# Altium footprint library Ultrascale_PcbLib.PcbLib: 132 footprints (part 7 of 9)
Each footprint in its own frame and in the unit in brackets; x right, y up, seen from the top. Pads: shape width x height; smd on the part's side, far side on the other; paste and mask are expansions set on the pad; w line width, h text height; cw(c..) or ccw(c..) is an arc to the next point about the centre after c.
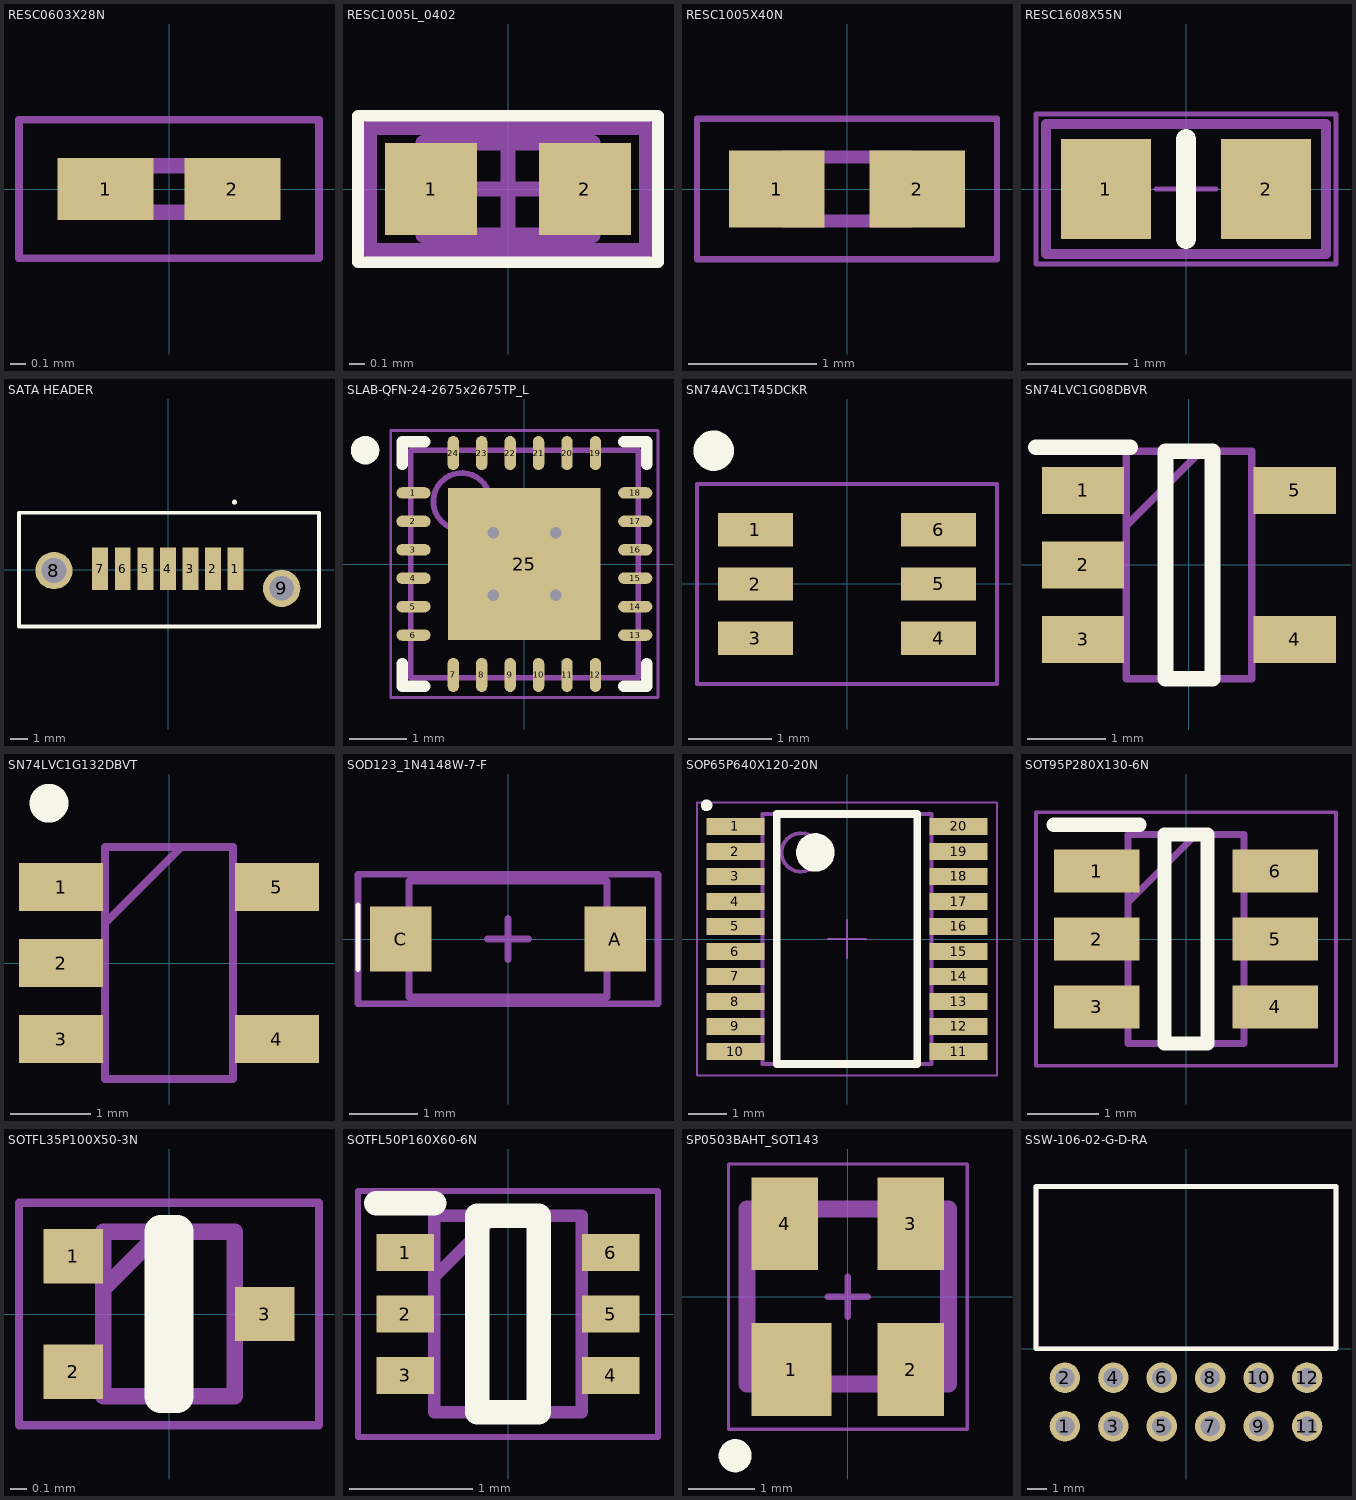
[diagram p6: the footprints below, top view; thin cyan lines are the x and y axes]

## RESC0603X28N [mm]
pads (2):
  rect 0.625x0.4 smd: 1(-0.412,0) 2(0.412,0)
Mechanical 15:
  lines w0.1: -0.3,-0.15 -0.3,0.15 0.3,0.15 0.3,-0.15 -0.3,-0.15
Mechanical 20:
  lines w0.05: -0.975,-0.45 -0.975,0.45 0.975,0.45 0.975,-0.45 -0.975,-0.45
3D body "CRCW0201240RFNED.stp": height 0.28, standoff 0, extent -0.3,-0.15 0.3,0.15

## RESC1005L_0402 [mm] "Chip Resistor, Body 1.1x0.5mm, IPC High Density"
height 0.4
pads (2):
  rect 0.6x0.6 smd mask+0.05: 1(-0.5,0) 2(0.5,0)
Top Overlay:
  lines w0.075: -0.975,-0.475 0.975,-0.475 0.975,0.475 -0.975,0.475 -0.975,-0.475
Mechanical 13:
  lines w0.1: -0.55,-0.3 -0.55,0.3 0.55,0.3 0.55,-0.3 -0.55,-0.3
Mechanical 15:
  lines w0.1: -0.3,0 0.3,0 ; 0,-0.3 0,0.3 ; -0.9,-0.4 -0.9,0.4 0.9,0.4 0.9,-0.4 -0.9,-0.4
3D body "User Library-RES_1005-0402.STEP": height 0.41, standoff 0, extent -0.575,-0.275 0.575,0.275

## RESC1005X40N [mm]
pads (2):
  rect 0.75x0.6 smd: 1(-0.55,0) 2(0.55,0)
Mechanical 15:
  lines w0.1: -0.5,-0.25 0.5,-0.25 0.5,0.25 -0.5,0.25 -0.5,-0.25
Mechanical 20:
  lines w0.05: -1.175,-0.55 1.175,-0.55 1.175,0.55 -1.175,0.55 -1.175,-0.55
3D body "CRCW04024K70FKED.stp": height 0.4, standoff 0, extent -0.5,-0.25 0.5,0.25

## RESC1608X55N [mm] "Chip Resistor, EIA 0603, Metric 1608, Body 1.6x0.8mm, IPC Medium Density"
height 0.55
pads (2):
  rect 0.9x1 smd: 1(-0.8,0) 2(0.8,0)
Top Overlay:
  lines w0.2: 0,-0.5 0,0.5
Mechanical 14:
  lines w0.1: -1.4,-0.65 1.4,-0.65 1.4,0.65 -1.4,0.65 -1.4,-0.65
Mechanical 15:
  lines w0.05: -0.3,0 0.3,0 ; 0,-0.3 0,0.3 ; -1.5,-0.75 -1.5,0.75 1.5,0.75 1.5,-0.75 -1.5,-0.75
3D body "RESC1608X55N.stp": height 0.55, standoff 0, extent -0.875,-0.475 0.875,0.475

## SATA HEADER [mm] "CONN HEADER 7POS VERT SMD 15GOLD"
pads (9):
  rect 0.9x2.4 smd: 1(3.795,0.05) 2(2.525,0.05) 3(1.255,0.05) 4(-0.015,0.05) 5(-1.285,0.05) 6(-2.555,0.05) 7(-3.825,0.05)
  round 2.1 hole 1.4: 8(-6.43,-0.05) 9(6.4,-1.05)
Top Overlay:
  circle w0.2: c3.737,3.8 r0.04
  lines w0.2: -8.4,-3.2 8.5,-3.2 8.5,3.2 -8.4,3.2 -8.4,-3.2
3D body "678005005.stp": height 8.41, standoff -2.64, extent -8.45,-3.225 8.45,3.225

## SLAB-QFN-24-2675x2675TP_L [mm] "QFN, 24-Leads, Body 4x4mm, Pitch 0.5mm, Thermal Pad 2.68x2.68mm, IPC High Density"
height 0.8
pads (25):
  oval 0.6x0.2 smd mask+0.05: 1(-1.95,1.25) 2(-1.95,0.75) 3(-1.95,0.25) 4(-1.95,-0.25) 5(-1.95,-0.75) 6(-1.95,-1.25) 13(1.95,-1.25) 14(1.95,-0.75) 15(1.95,-0.25) 16(1.95,0.25) 17(1.95,0.75) 18(1.95,1.25)
  oval 0.2x0.6 smd mask+0.05: 7(-1.25,-1.95) 8(-0.75,-1.95) 9(-0.25,-1.95) 10(0.25,-1.95) 11(0.75,-1.95) 12(1.25,-1.95) 19(1.25,1.95) 20(0.75,1.95) 21(0.25,1.95) 22(-0.25,1.95) 23(-0.75,1.95) 24(-1.25,1.95)
  rect 2.68x2.68 smd mask+0.05: 25(0,0)
via 0.55,-0.55 diameter 0.5 hole 0.2
via -0.55,-0.55 diameter 0.5 hole 0.2
via 0.55,0.55 diameter 0.5 hole 0.2
via -0.55,0.55 diameter 0.5 hole 0.2
Top Overlay:
  circle w0.25: c-2.8,2 r0.125
  lines w0.2: -2.15,-1.75 -2.15,-2.15 -1.75,-2.15 ; -2.15,1.75 -2.15,2.15 -1.75,2.15 ; 1.75,-2.15 2.15,-2.15 2.15,-1.75 ; 1.75,2.15 2.15,2.15 2.15,1.75
Mechanical 13:
  circle w0.1: c-1.1,1.1 r0.5
  lines w0.1: -2,-2 2,-2 2,2 -2,2 -2,-2
Mechanical 15:
  lines w0.05: -2.35,-2.35 2.35,-2.35 2.35,2.35 -2.35,2.35 -2.35,-2.35
  lines w0.1: -0.5,0 0.5,0 ; 0,-0.5 0,0.5
3D body: height 0.8, standoff 0, extent -2,-2 2,2

## SN74AVC1T45DCKR [mm] "IC BUS TRANSCVR TRI-ST SC70-6"
pads (6):
  rect 0.9x0.4 smd mask+0.05: 1(-1.1,0.65) 2(-1.1,0) 3(-1.1,-0.65) 4(1.1,-0.65) 5(1.1,0) 6(1.1,0.65)
Top Overlay:
  circle w0.325: c-1.6,1.6 r0.08
Mechanical 20:
  lines w0.05: -1.8,-1.2 1.8,-1.2 1.8,1.2 -1.8,1.2 -1.8,-1.2
3D body "DCK6.step": height 1.09, standoff 0, extent -1.206,-1.08 1.206,1.08

## SN74LVC1G08DBVR [mm] "IC GATE AND 1CH 2-INP SOT-23-5"
pads (5):
  rect 1.05x0.6 smd mask+0.07: 1(-1.35,0.95) 2(-1.35,0) 3(-1.35,-0.95) 4(1.35,-0.95) 5(1.35,0.95)
Top Overlay:
  lines w0.2: -1.95,1.5 -0.75,1.5 ; -0.3,-1.45 0.3,-1.45 0.3,1.45 -0.3,1.45 -0.3,-1.45
Mechanical 15:
  lines w0.1: -0.8,0.5 0.15,1.45 ; -0.8,-1.45 0.8,-1.45 0.8,1.45 -0.8,1.45 -0.8,-1.45
3D body "SN74LVC1G08DBVR.stp": height 1.45, standoff 0, extent -1.4,-1.45 1.4,1.45

## SN74LVC1G132DBVT [mm] "IC GATE NAND 1CH 2-INP SOT-23-5"
pads (5):
  rect 1.05x0.6 smd mask+0.07: 1(-1.35,0.95) 2(-1.35,0) 3(-1.35,-0.95) 4(1.35,-0.95) 5(1.35,0.95)
Top Overlay:
  circle w0.325: c-1.5,2 r0.08
Mechanical 15:
  lines w0.1: -0.8,0.5 0.15,1.45 ; -0.8,-1.45 -0.8,1.45 0.8,1.45 0.8,-1.45 -0.8,-1.45
3D body "DBV5.step": height 1.45, standoff 0, extent -1.499,-1.524 1.499,1.524

## SOD123_1N4148W-7-F [mm] "DIODE GEN PURP 100V 300MA SOD123"
height 1.35
pads (2):
  rect 0.9x0.95 smd mask+0.05: A(1.575,0) C(-1.575,0)
Top Overlay:
  lines w0.075: -2.2,-0.45 -2.2,0.5
Mechanical 13:
  lines w0.1: -1.45,-0.85 1.45,-0.85 1.45,0.85 -1.45,0.85 -1.45,-0.85
Mechanical 15:
  lines w0.1: -0.3,0 0.3,0 ; 0,-0.3 0,0.3 ; -2.2,-0.95 2.2,-0.95 2.2,0.95 -2.2,0.95 -2.2,-0.95
3D body: height 1.35, standoff 0, extent -1.45,-0.85 1.45,0.85

## SOP65P640X120-20N [mm] "SOP, 20-Leads, Body 6.5x4.4mm, Pitch 0.65mm, IPC Medium Density"
height 1.2
pads (20):
  rect 1.5x0.45 smd: 1(-2.9,2.925) 2(-2.9,2.275) 3(-2.9,1.625) 4(-2.9,0.975) 5(-2.9,0.325) 6(-2.9,-0.325) 7(-2.9,-0.975) 8(-2.9,-1.625) 9(-2.9,-2.275) 10(-2.9,-2.925) 11(2.9,-2.925) 12(2.9,-2.275) 13(2.9,-1.625) 14(2.9,-0.975) 15(2.9,-0.325) 16(2.9,0.325) 17(2.9,0.975) 18(2.9,1.625) 19(2.9,2.275) 20(2.9,2.925)
Top Overlay:
  circle w0.5: c-0.825,2.25 r0.25
  circle w0.254: c-3.65,3.475 r0.025
  lines w0.2: -1.825,-3.25 1.825,-3.25 1.825,3.25 -1.825,3.25 -1.825,-3.25
Mechanical 14:
  circle w0.1: c-1.2,2.25 r0.5
  lines w0.1: -2.2,-3.25 2.2,-3.25 2.2,3.25 -2.2,3.25 -2.2,-3.25
Mechanical 15:
  lines w0.05: -0.5,0 0.5,0 ; 0,-0.5 0,0.5 ; -3.9,-3.55 3.9,-3.55 3.9,3.55 -3.9,3.55 -3.9,-3.55
3D body "SOP65P640X120-20N.stp": height 1.2, standoff 0, extent -3.121,-3.3 3.121,3.3

## SOT95P280X130-6N [mm] "TVS DIODE 20VWM SMD"
pads (6):
  rect 1.2x0.6 smd: 1(-1.25,0.95) 2(-1.25,0) 3(-1.25,-0.95) 4(1.25,-0.95) 5(1.25,0) 6(1.25,0.95)
Top Overlay:
  lines w0.2: -1.85,1.6 -0.65,1.6 ; -0.3,-1.462 0.3,-1.462 0.3,1.462 -0.3,1.462 -0.3,-1.462
Mechanical 15:
  lines w0.1: -0.812,0.512 0.138,1.462 ; -0.812,-1.462 0.812,-1.462 0.812,1.462 -0.812,1.462 -0.812,-1.462
Mechanical 20:
  lines w0.05: -2.1,-1.775 2.1,-1.775 2.1,1.775 -2.1,1.775 -2.1,-1.775

## SOTFL35P100X50-3N [mm] "TVS DIODE 5.5VWM 8VC SOT3"
pads (3):
  rect 0.36x0.33 smd: 1(-0.58,0.35) 2(-0.58,-0.35) 3(0.58,0)
Top Overlay:
  lines w0.2: -0.05,-0.5 -0.05,0.5 0.05,0.5 0.05,-0.5 -0.05,-0.5
Mechanical 15:
  lines w0.1: -0.4,0.15 -0.05,0.5 ; -0.4,-0.5 -0.4,0.5 0.4,0.5 0.4,-0.5 -0.4,-0.5
Mechanical 20:
  lines w0.05: -0.91,-0.675 -0.91,0.675 0.91,0.675 0.91,-0.675 -0.91,-0.675

## SOTFL50P160X60-6N [mm] "TVS DIODE 5.5VWM SOT6"
pads (6):
  rect 0.47x0.3 smd: 1(-0.835,0.5) 2(-0.835,0) 3(-0.835,-0.5) 4(0.835,-0.5) 5(0.835,0) 6(0.835,0.5)
Top Overlay:
  lines w0.2: -1.07,0.9 -0.6,0.9 ; -0.25,-0.8 -0.25,0.8 0.25,0.8 0.25,-0.8 -0.25,-0.8
Mechanical 15:
  lines w0.1: -0.6,0.3 -0.1,0.8 ; -0.6,-0.8 -0.6,0.8 0.6,0.8 0.6,-0.8 -0.6,-0.8
Mechanical 20:
  lines w0.05: -1.22,-1 -1.22,1 1.22,1 1.22,-1 -1.22,-1
3D body "DRL6.step": height 0.61, standoff 0, extent -0.851,-0.851 0.851,0.851

## SP0503BAHT_SOT143 [mm] "LITTELFUSE TVS DIODE 5.5VWM 8.5VC SOT143"
height 1.22
pads (4):
  rect 1.2x1.4 smd paste+0.05: 1(-0.85,-1.1)
  rect 1x1.4 smd paste+0.05: 2(0.95,-1.1) 3(0.95,1.1) 4(-0.95,1.1)
Top Overlay:
  circle w0.25: c-1.7,-2.4 r0.125
Mechanical 13:
  lines w0.254: -1.52,-1.32 -1.52,1.32 1.52,1.32 1.52,-1.32 -1.52,-1.32
Mechanical 15:
  lines w0.05: -1.8,-2 -1.8,2 1.8,2 1.8,-2 -1.8,-2
  lines w0.1: -0.3,0 0.3,0 ; 0,-0.3 0,0.3
3D body: height 1.22, standoff 0, extent -1.52,-1.32 1.52,1.32

## SSW-106-02-G-D-RA [mm]
pads (12):
  round 1.6 hole 1.02: 1(-6.35,-4.064) 2(-6.35,-1.524) 3(-3.81,-4.064) 4(-3.81,-1.524) 5(-1.27,-4.064) 6(-1.27,-1.524) 7(1.27,-4.064) 8(1.27,-1.524) 9(3.81,-4.064) 10(3.81,-1.524) 11(6.35,-4.064) 12(6.35,-1.524)
Top Overlay:
  lines w0.254: -7.87,0 -7.87,8.51 7.87,8.51 7.87,0 -7.87,0
Mechanical 15:
  lines w0.254: -7.87,0 7.87,0 7.87,8.51 -7.87,8.51 -7.87,0
3D body "SSW-106-02-T-D-RA.stp": height 4.97, standoff -2.51, extent -7.874,-4.267 7.874,8.509